# Altium footprint library cool_library.PcbLib: 1182 footprints (part 65 of 75)
Each footprint in its own frame and in the unit in brackets; x right, y up, seen from the top. Pads: shape width x height; smd on the part's side, far side on the other; paste and mask are expansions set on the pad; w line width, h text height; cw(c..) or ccw(c..) is an arc to the next point about the centre after c.
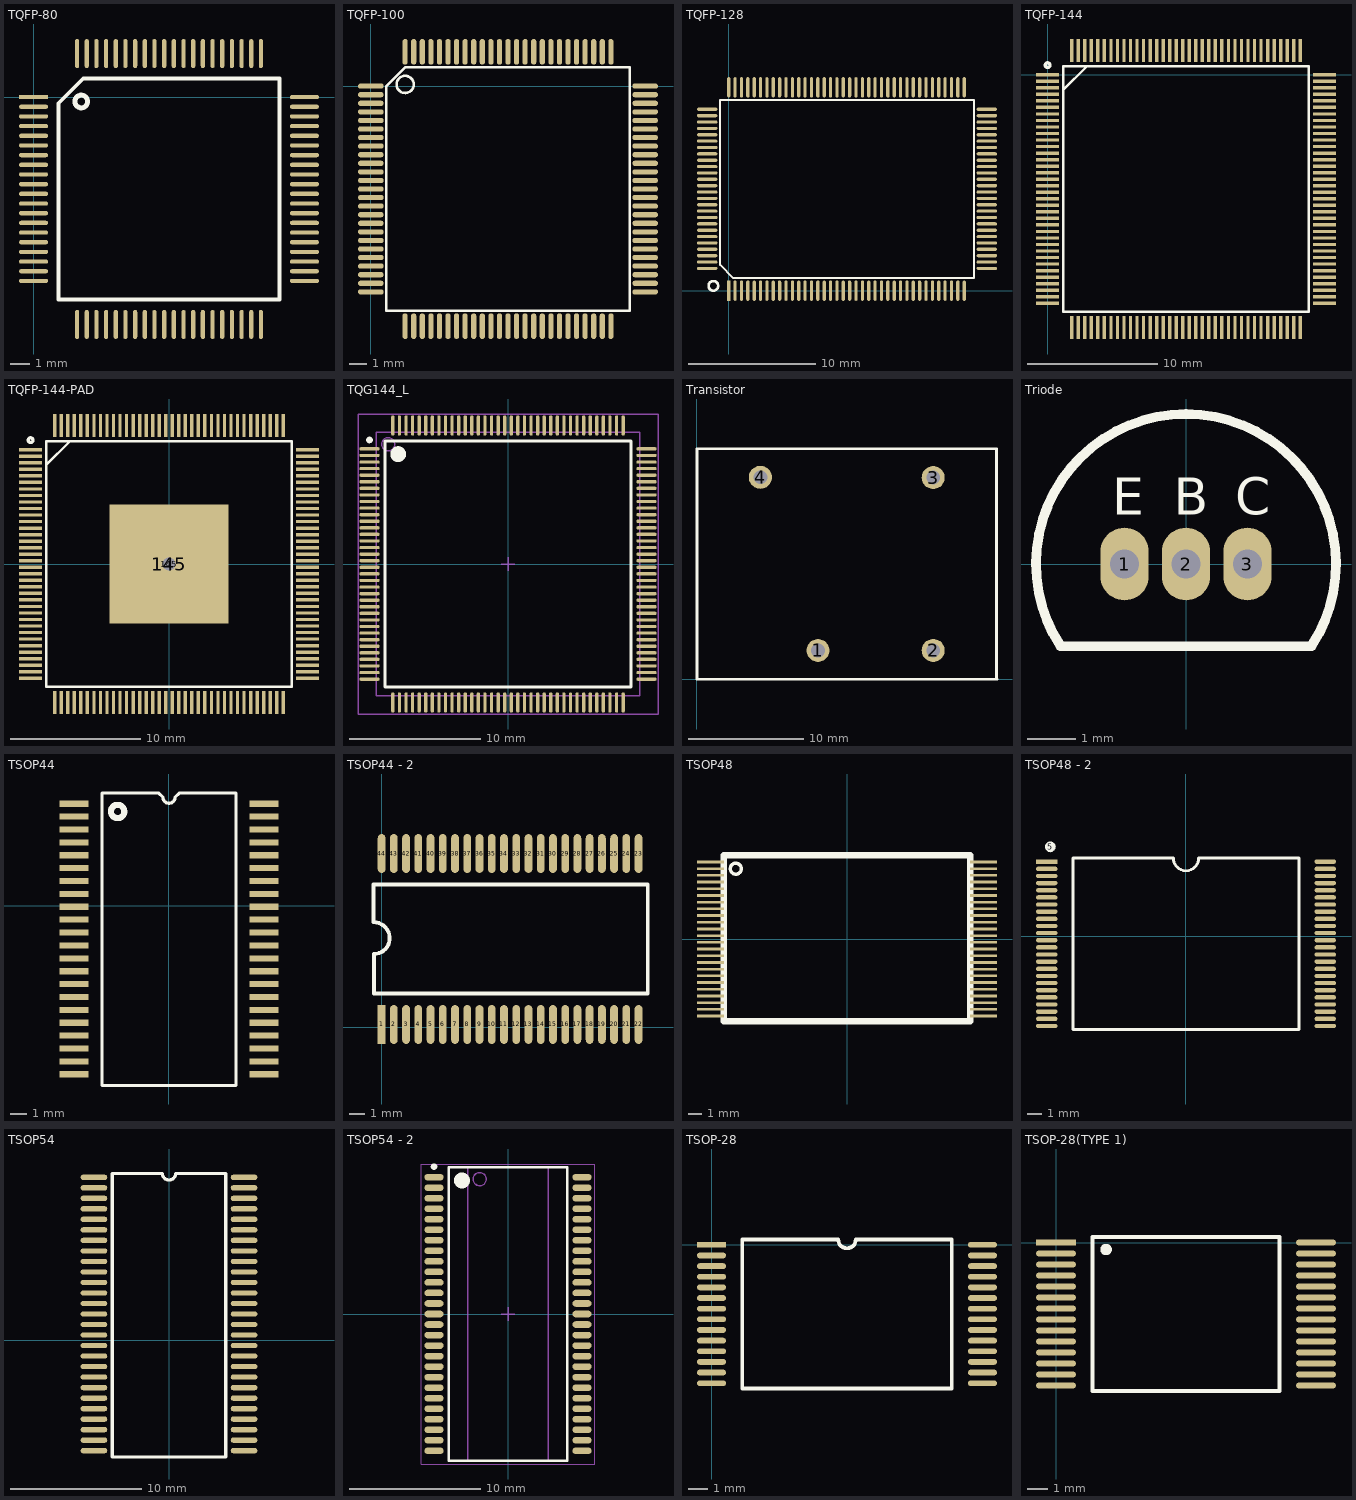
[diagram p64: the footprints below, top view; thin cyan lines are the x and y axes]

## TQFP-80 [mm]
pads (80):
  rect 1.5x0.22 smd: 1(0,0)
  oval 1.5x0.22 smd: 2(0,-0.5) 3(0,-1) 4(0,-1.5) 5(0,-2) 6(0,-2.5) 7(0,-3) 8(0,-3.5) 9(0,-4) 10(0,-4.5) 11(0,-5) 12(0,-5.5) 13(0,-6) 14(0,-6.5) 15(0,-7) 16(0,-7.5) 17(0,-8) 18(0,-8.5) 19(0,-9) 20(0,-9.5) 41(14,-9.5) 42(14,-9) 43(14,-8.5) 44(14,-8) 45(14,-7.5) 46(14,-7) 47(14,-6.5) 48(14,-6) 49(14,-5.5) 50(14,-5) 51(14,-4.5) 52(14,-4) 53(14,-3.5) 54(14,-3) 55(14,-2.5) 56(14,-2) 57(14,-1.5) 58(14,-1) 59(14,-0.5) 60(14,0)
  oval 0.22x1.5 smd: 21(2.25,-11.75) 22(2.75,-11.75) 23(3.25,-11.75) 24(3.75,-11.75) 25(4.25,-11.75) 26(4.75,-11.75) 27(5.25,-11.75) 28(5.75,-11.75) 29(6.25,-11.75) 30(6.75,-11.75) 31(7.25,-11.75) 32(7.75,-11.75) 33(8.25,-11.75) 34(8.75,-11.75) 35(9.25,-11.75) 36(9.75,-11.75) 37(10.25,-11.75) 38(10.75,-11.75) 39(11.25,-11.75) 40(11.75,-11.75) 61(11.75,2.25) 62(11.25,2.25) 63(10.75,2.25) 64(10.25,2.25) 65(9.75,2.25) 66(9.25,2.25) 67(8.75,2.25) 68(8.25,2.25) 69(7.75,2.25) 70(7.25,2.25) 71(6.75,2.25) 72(6.25,2.25) 73(5.75,2.25) 74(5.25,2.25) 75(4.75,2.25) 76(4.25,2.25) 77(3.75,2.25) 78(3.25,2.25) 79(2.75,2.25) 80(2.25,2.25)
Top Overlay:
  circle w0.254: c2.465,-0.229 r0.329
  lines w0.2: 1.285,-10.465 12.715,-10.465 12.715,0.965 2.57,0.965 1.285,-0.32 1.285,-10.465

## TQFP-100 [mm]
pads (100):
  oval 1.5x0.3 smd: 1(0,0) 2(0,-0.5) 3(0,-1) 4(0,-1.5) 5(0,-2) 6(0,-2.5) 7(0,-3) 8(0,-3.5) 9(0,-4) 10(0,-4.5) 11(0,-5) 12(0,-5.5) 13(0,-6) 14(0,-6.5) 15(0,-7) 16(0,-7.5) 17(0,-8) 18(0,-8.5) 19(0,-9) 20(0,-9.5) 21(0,-10) 22(0,-10.5) 23(0,-11) 24(0,-11.5) 25(0,-12) 51(16,-12) 52(16,-11.5) 53(16,-11) 54(16,-10.5) 55(16,-10) 56(16,-9.5) 57(16,-9) 58(16,-8.5) 59(16,-8) 60(16,-7.5) 61(16,-7) 62(16,-6.5) 63(16,-6) 64(16,-5.5) 65(16,-5) 66(16,-4.5) 67(16,-4) 68(16,-3.5) 69(16,-3) 70(16,-2.5) 71(16,-2) 72(16,-1.5) 73(16,-1) 74(16,-0.5) 75(16,0)
  oval 0.3x1.5 smd: 26(2,-14) 27(2.5,-14) 28(3,-14) 29(3.5,-14) 30(4,-14) 31(4.5,-14) 32(5,-14) 33(5.5,-14) 34(6,-14) 35(6.5,-14) 36(7,-14) 37(7.5,-14) 38(8,-14) 39(8.5,-14) 40(9,-14) 41(9.5,-14) 42(10,-14) 43(10.5,-14) 44(11,-14) 45(11.5,-14) 46(12,-14) 47(12.5,-14) 48(13,-14) 49(13.5,-14) 50(14,-14) 76(14,2) 77(13.5,2) 78(13,2) 79(12.5,2) 80(12,2) 81(11.5,2) 82(11,2) 83(10.5,2) 84(10,2) 85(9.5,2) 86(9,2) 87(8.5,2) 88(8,2) 89(7.5,2) 90(7,2) 91(6.5,2) 92(6,2) 93(5.5,2) 94(5,2) 95(4.5,2) 96(4,2) 97(3.5,2) 98(3,2) 99(2.5,2) 100(2,2)
Top Overlay:
  circle w0.152: c2,0.1 r0.5
  lines w0.152: 0.9,-13.1 15.1,-13.1 15.1,1.1 2,1.1 0.9,0 0.9,-13.1

## TQFP-128 [mil]
pads (128):
  rect 10x62.99 smd: 1(0,0)
  oval 10x62.99 smd: 2(19.68,0) 3(39.37,0) 4(59.05,0) 5(78.74,0) 6(98.42,0) 7(118.11,0) 8(137.79,0) 9(157.48,0) 10(177.16,0) 11(196.85,0) 12(216.53,0) 13(236.22,0) 14(255.91,0) 15(275.59,0) 16(295.27,0) 17(314.96,0) 18(334.64,0) 19(354.33,0) 20(374.01,0) 21(393.7,0) 22(413.38,0) 23(433.07,0) 24(452.75,0) 25(472.44,0) 26(492.12,0) 27(511.81,0) 28(531.5,0) 29(551.18,0) 30(570.87,0) 31(590.55,0) 32(610.24,0) 33(629.92,0) 34(649.61,0) 35(669.29,0) 36(688.98,0) 37(708.66,0) 38(728.35,0) 65(728.35,629) 66(708.66,629) 67(688.98,629) 68(669.29,629) 69(649.61,629) 70(629.92,629) 71(610.24,629) 72(590.55,629) 73(570.87,629) 74(551.18,629) 75(531.5,629) 76(511.81,629) 77(492.12,629) 78(472.44,629) 79(452.75,629) 80(433.07,629) 81(413.38,629) 82(393.7,629) 83(374.01,629) 84(354.33,629) 85(334.64,629) 86(314.96,629) 87(295.27,629) 88(275.59,629) 89(255.91,629) 90(236.22,629) 91(216.53,629) 92(196.85,629) 93(177.16,629) 94(157.48,629) 95(137.79,629) 96(118.11,629) 97(98.42,629) 98(78.74,629) 99(59.05,629) 100(39.37,629) 101(19.68,629) 102(0,629)
  oval 62.99x10 smd: 39(798.35,68.88) 40(798.35,88.56) 41(798.35,108.25) 42(798.35,127.93) 43(798.35,147.62) 44(798.35,167.3) 45(798.35,186.99) 46(798.35,206.67) 47(798.35,226.35) 48(798.35,246.04) 49(798.35,265.73) 50(798.35,285.41) 51(798.35,305.1) 52(798.35,324.78) 53(798.35,344.46) 54(798.35,364.15) 55(798.35,383.83) 56(798.35,403.52) 57(798.35,423.2) 58(798.35,442.89) 59(798.35,462.57) 60(798.35,482.26) 61(798.35,501.94) 62(798.35,521.63) 63(798.35,541.32) 64(798.35,561) 103(-66.66,561) 104(-66.66,541.32) 105(-66.66,521.63) 106(-66.66,501.94) 107(-66.66,482.26) 108(-66.66,462.57) 109(-66.66,442.89) 110(-66.66,423.2) 111(-66.66,403.52) 112(-66.66,383.83) 113(-66.66,364.15) 114(-66.66,344.46) 115(-66.66,324.78) 116(-66.66,305.1) 117(-66.66,285.41) 118(-66.66,265.73) 119(-66.66,246.04) 120(-66.66,226.35) 121(-66.66,206.67) 122(-66.66,186.99) 123(-66.66,167.3) 124(-66.66,147.62) 125(-66.66,127.93) 126(-66.66,108.25) 127(-66.66,88.56) 128(-66.66,68.88)
Top Overlay:
  circle w8: c-47.52,14.88 r14.87
  lines w6: -26.66,79.88 14.35,38.88 759.35,38.88 759.35,589.88 -26.66,589.88 -26.66,79.88

## TQFP-144 [mil]
pads (144):
  rect 70x10 smd: 1(0,0) 2(0,-19.68) 3(0,-39.37) 4(0,-59.05) 5(0,-78.74) 6(0,-98.42) 7(0,-118.11) 8(0,-137.79) 9(0,-157.48) 10(0,-177.16) 11(0,-196.85) 12(0,-216.53) 13(0,-236.22) 14(0,-255.91) 15(0,-275.59) 16(0,-295.28) 17(0,-314.96) 18(0,-334.65) 19(0,-354.33) 20(0,-374.02) 21(0,-393.7) 22(0,-413.39) 23(0,-433.07) 24(0,-452.76) 25(0,-472.44) 26(0,-492.13) 27(0,-511.81) 28(0,-531.5) 29(0,-551.18) 30(0,-570.87) 31(0,-590.55) 32(0,-610.24) 33(0,-629.92) 34(0,-649.61) 35(0,-669.29) 36(0,-688.98) 73(834.65,-688.98) 74(834.65,-669.29) 75(834.65,-649.61) 76(834.65,-629.92) 77(834.65,-610.24) 78(834.65,-590.55) 79(834.65,-570.87) 80(834.65,-551.18) 81(834.65,-531.5) 82(834.65,-511.81) 83(834.65,-492.13) 84(834.65,-472.44) 85(834.65,-452.76) 86(834.65,-433.07) 87(834.65,-413.39) 88(834.65,-393.7) 89(834.65,-374.02) 90(834.65,-354.33) 91(834.65,-334.65) 92(834.65,-314.96) 93(834.65,-295.28) 94(834.65,-275.59) 95(834.65,-255.91) 96(834.65,-236.22) 97(834.65,-216.53) 98(834.65,-196.85) 99(834.65,-177.16) 100(834.65,-157.48) 101(834.65,-137.79) 102(834.65,-118.11) 103(834.65,-98.42) 104(834.65,-78.74) 105(834.65,-59.05) 106(834.65,-39.37) 107(834.65,-19.68) 108(834.65,0)
  rect 10x70 smd: 37(72.83,-761.81) 38(92.52,-761.81) 39(112.2,-761.81) 40(131.89,-761.81) 41(151.57,-761.81) 42(171.26,-761.81) 43(190.94,-761.81) 44(210.63,-761.81) 45(230.31,-761.81) 46(250,-761.81) 47(269.69,-761.81) 48(289.37,-761.81) 49(309.06,-761.81) 50(328.74,-761.81) 51(348.43,-761.81) 52(368.11,-761.81) 53(387.8,-761.81) 54(407.48,-761.81) 55(427.17,-761.81) 56(446.85,-761.81) 57(466.54,-761.81) 58(486.22,-761.81) 59(505.91,-761.81) 60(525.59,-761.81) 61(545.28,-761.81) 62(564.96,-761.81) 63(584.65,-761.81) 64(604.33,-761.81) 65(624.02,-761.81) 66(643.7,-761.81) 67(663.39,-761.81) 68(683.07,-761.81) 69(702.76,-761.81) 70(722.44,-761.81) 71(742.13,-761.81) 72(761.81,-761.81) 109(761.81,72.83) 110(742.13,72.83) 111(722.44,72.83) 112(702.76,72.83) 113(683.07,72.83) 114(663.39,72.83) 115(643.7,72.83) 116(624.02,72.83) 117(604.33,72.83) 118(584.65,72.83) 119(564.96,72.83) 120(545.28,72.83) 121(525.59,72.83) 122(505.91,72.83) 123(486.22,72.83) 124(466.54,72.83) 125(446.85,72.83) 126(427.17,72.83) 127(407.48,72.83) 128(387.8,72.83) 129(368.11,72.83) 130(348.43,72.83) 131(328.74,72.83) 132(309.06,72.83) 133(289.37,72.83) 134(269.69,72.83) 135(250,72.83) 136(230.31,72.83) 137(210.63,72.83) 138(190.94,72.83) 139(171.26,72.83) 140(151.57,72.83) 141(131.89,72.83) 142(112.2,72.83) 143(92.52,72.83) 144(72.83,72.83)
Top Overlay:
  circle w9.84: c-0.02,29 r7.02
  lines w7.8: 47.41,-45 118,25.59
  lines w7.87: 47.24,-714.57 47.24,25.59 787.4,25.59 787.4,-714.57 47.24,-714.57

## TQFP-144-PAD [mil]
height 50
pads (146):
  rect 70x10 smd: 1(-417.32,344.49) 2(-417.32,324.8) 3(-417.32,305.12) 4(-417.32,285.43) 5(-417.32,265.75) 6(-417.32,246.06) 7(-417.32,226.38) 8(-417.32,206.69) 9(-417.32,187.01) 10(-417.32,167.32) 11(-417.32,147.64) 12(-417.32,127.95) 13(-417.32,108.27) 14(-417.32,88.58) 15(-417.32,68.9) 16(-417.32,49.21) 17(-417.32,29.53) 18(-417.32,9.84) 19(-417.32,-9.84) 20(-417.32,-29.53) 21(-417.32,-49.21) 22(-417.32,-68.9) 23(-417.32,-88.58) 24(-417.32,-108.27) 25(-417.32,-127.95) 26(-417.32,-147.64) 27(-417.32,-167.32) 28(-417.32,-187.01) 29(-417.32,-206.69) 30(-417.32,-226.38) 31(-417.32,-246.06) 32(-417.32,-265.75) 33(-417.32,-285.43) 34(-417.32,-305.12) 35(-417.32,-324.8) 36(-417.32,-344.49) 73(417.32,-344.49) 74(417.32,-324.8) 75(417.32,-305.12) 76(417.32,-285.43) 77(417.32,-265.75) 78(417.32,-246.06) 79(417.32,-226.38) 80(417.32,-206.69) 81(417.32,-187.01) 82(417.32,-167.32) 83(417.32,-147.64) 84(417.32,-127.95) 85(417.32,-108.27) 86(417.32,-88.58) 87(417.32,-68.9) 88(417.32,-49.21) 89(417.32,-29.53) 90(417.32,-9.84) 91(417.32,9.84) 92(417.32,29.53) 93(417.32,49.21) 94(417.32,68.9) 95(417.32,88.58) 96(417.32,108.27) 97(417.32,127.95) 98(417.32,147.64) 99(417.32,167.32) 100(417.32,187.01) 101(417.32,206.69) 102(417.32,226.38) 103(417.32,246.06) 104(417.32,265.75) 105(417.32,285.43) 106(417.32,305.12) 107(417.32,324.8) 108(417.32,344.49)
  rect 10x70 smd: 37(-344.49,-417.32) 38(-324.8,-417.32) 39(-305.12,-417.32) 40(-285.43,-417.32) 41(-265.75,-417.32) 42(-246.06,-417.32) 43(-226.38,-417.32) 44(-206.69,-417.32) 45(-187.01,-417.32) 46(-167.32,-417.32) 47(-147.64,-417.32) 48(-127.95,-417.32) 49(-108.27,-417.32) 50(-88.58,-417.32) 51(-68.9,-417.32) 52(-49.21,-417.32) 53(-29.53,-417.32) 54(-9.84,-417.32) 55(9.84,-417.32) 56(29.53,-417.32) 57(49.21,-417.32) 58(68.9,-417.32) 59(88.58,-417.32) 60(108.27,-417.32) 61(127.95,-417.32) 62(147.64,-417.32) 63(167.32,-417.32) 64(187.01,-417.32) 65(206.69,-417.32) 66(226.38,-417.32) 67(246.06,-417.32) 68(265.75,-417.32) 69(285.43,-417.32) 70(305.12,-417.32) 71(324.8,-417.32) 72(344.49,-417.32) 109(344.49,417.32) 110(324.8,417.32) 111(305.12,417.32) 112(285.43,417.32) 113(265.75,417.32) 114(246.06,417.32) 115(226.38,417.32) 116(206.69,417.32) 117(187.01,417.32) 118(167.32,417.32) 119(147.64,417.32) 120(127.95,417.32) 121(108.27,417.32) 122(88.58,417.32) 123(68.9,417.32) 124(49.21,417.32) 125(29.53,417.32) 126(9.84,417.32) 127(-9.84,417.32) 128(-29.53,417.32) 129(-49.21,417.32) 130(-68.9,417.32) 131(-88.58,417.32) 132(-108.27,417.32) 133(-127.95,417.32) 134(-147.64,417.32) 135(-167.32,417.32) 136(-187.01,417.32) 137(-206.69,417.32) 138(-226.38,417.32) 139(-246.06,417.32) 140(-265.75,417.32) 141(-285.43,417.32) 142(-305.12,417.32) 143(-324.8,417.32) 144(-344.49,417.32)
  rect 360x360 smd: 145(0,0)
  oct 62x62 hole 40: 145(0,0)
Top Overlay:
  circle w9.84: c-417.35,373.49 r7.02
  lines w7.8: -369.91,299.49 -299.32,370.08
  lines w7.87: -370.08,-370.08 370.08,-370.08 370.08,370.08 -370.08,370.08 -370.08,-370.08
Top Solder:
  region: 30,180 30,30 180,30 180,180
  region: 180,-30 30,-30 30,-180 180,-180
  region: -30,-180 -30,-30 -180,-30 -180,-180
  rectangle: -180,30 -30,180

## TQG144_L [mm] "Thin QFP, 144-Leads, Body 20x20mm, Pitch 0.5mm, IPC High Density"
height 1.6
pads (144):
  oval 1.55x0.25 smd: 1(-10.525,8.75) 2(-10.525,8.25) 3(-10.525,7.75) 4(-10.525,7.25) 5(-10.525,6.75) 6(-10.525,6.25) 7(-10.525,5.75) 8(-10.525,5.25) 9(-10.525,4.75) 10(-10.525,4.25) 11(-10.525,3.75) 12(-10.525,3.25) 13(-10.525,2.75) 14(-10.525,2.25) 15(-10.525,1.75) 16(-10.525,1.25) 17(-10.525,0.75) 18(-10.525,0.25) 19(-10.525,-0.25) 20(-10.525,-0.75) 21(-10.525,-1.25) 22(-10.525,-1.75) 23(-10.525,-2.25) 24(-10.525,-2.75) 25(-10.525,-3.25) 26(-10.525,-3.75) 27(-10.525,-4.25) 28(-10.525,-4.75) 29(-10.525,-5.25) 30(-10.525,-5.75) 31(-10.525,-6.25) 32(-10.525,-6.75) 33(-10.525,-7.25) 34(-10.525,-7.75) 35(-10.525,-8.25) 36(-10.525,-8.75) 73(10.525,-8.75) 74(10.525,-8.25) 75(10.525,-7.75) 76(10.525,-7.25) 77(10.525,-6.75) 78(10.525,-6.25) 79(10.525,-5.75) 80(10.525,-5.25) 81(10.525,-4.75) 82(10.525,-4.25) 83(10.525,-3.75) 84(10.525,-3.25) 85(10.525,-2.75) 86(10.525,-2.25) 87(10.525,-1.75) 88(10.525,-1.25) 89(10.525,-0.75) 90(10.525,-0.25) 91(10.525,0.25) 92(10.525,0.75) 93(10.525,1.25) 94(10.525,1.75) 95(10.525,2.25) 96(10.525,2.75) 97(10.525,3.25) 98(10.525,3.75) 99(10.525,4.25) 100(10.525,4.75) 101(10.525,5.25) 102(10.525,5.75) 103(10.525,6.25) 104(10.525,6.75) 105(10.525,7.25) 106(10.525,7.75) 107(10.525,8.25) 108(10.525,8.75)
  oval 0.25x1.55 smd: 37(-8.75,-10.525) 38(-8.25,-10.525) 39(-7.75,-10.525) 40(-7.25,-10.525) 41(-6.75,-10.525) 42(-6.25,-10.525) 43(-5.75,-10.525) 44(-5.25,-10.525) 45(-4.75,-10.525) 46(-4.25,-10.525) 47(-3.75,-10.525) 48(-3.25,-10.525) 49(-2.75,-10.525) 50(-2.25,-10.525) 51(-1.75,-10.525) 52(-1.25,-10.525) 53(-0.75,-10.525) 54(-0.25,-10.525) 55(0.25,-10.525) 56(0.75,-10.525) 57(1.25,-10.525) 58(1.75,-10.525) 59(2.25,-10.525) 60(2.75,-10.525) 61(3.25,-10.525) 62(3.75,-10.525) 63(4.25,-10.525) 64(4.75,-10.525) 65(5.25,-10.525) 66(5.75,-10.525) 67(6.25,-10.525) 68(6.75,-10.525) 69(7.25,-10.525) 70(7.75,-10.525) 71(8.25,-10.525) 72(8.75,-10.525) 109(8.75,10.525) 110(8.25,10.525) 111(7.75,10.525) 112(7.25,10.525) 113(6.75,10.525) 114(6.25,10.525) 115(5.75,10.525) 116(5.25,10.525) 117(4.75,10.525) 118(4.25,10.525) 119(3.75,10.525) 120(3.25,10.525) 121(2.75,10.525) 122(2.25,10.525) 123(1.75,10.525) 124(1.25,10.525) 125(0.75,10.525) 126(0.25,10.525) 127(-0.25,10.525) 128(-0.75,10.525) 129(-1.25,10.525) 130(-1.75,10.525) 131(-2.25,10.525) 132(-2.75,10.525) 133(-3.25,10.525) 134(-3.75,10.525) 135(-4.25,10.525) 136(-4.75,10.525) 137(-5.25,10.525) 138(-5.75,10.525) 139(-6.25,10.525) 140(-6.75,10.525) 141(-7.25,10.525) 142(-7.75,10.525) 143(-8.25,10.525) 144(-8.75,10.525)
Top Overlay:
  circle w0.6: c-8.35,8.35 r0.3
  circle w0.25: c-10.525,9.425 r0.125
  lines w0.2: -9.35,-9.35 9.35,-9.35 9.35,9.35 -9.35,9.35 -9.35,-9.35
Mechanical 13:
  circle w0.1: c-9.1,9.1 r0.5
  lines w0.1: -10,-10 10,-10 10,10 -10,10 -10,-10
Mechanical 15:
  lines w0.1: -0.5,0 0.5,0 ; 0,-0.5 0,0.5 ; -11.4,-11.4 11.4,-11.4 11.4,11.4 -11.4,11.4 -11.4,-11.4
3D body: height 1.6, standoff 0, extent -10,-10 10,10

## Transistor [mm]
pads (4):
  round 2 hole 1.2: 1(10.5,2.5) 2(20.5,2.5) 3(20.5,17.5) 4(5.5,17.526)
Top Overlay:
  lines w0.254: 26,0 26,20 0,20 0,0 26.035,0

## Triode [mm]
pads (3):
  oval 1x1.5 hole 0.6: 1(-1.27,0) 2(0,0) 3(1.27,0)
Top Overlay:
  circle w0.2: c0,0 r0.129
  lines w0.2: -2.592,-1.7 cw(c0,0) 2.592,-1.7 -2.592,-1.7
  text "E" at -1.524,1.016 h0.76
  text "B" at -0.254,1.016 h0.76
  text "C" at 1.016,1.016 h0.76
3D body: height 10.31, standoff -5.8, extent -3.12,-1.68 3.08,3.13

## TSOP44 [mil] "贴片"
pads (44):
  rect 72x15 smd: 1(-231.5,249.21) 2(-231.5,217.72) 3(-231.5,186.22) 4(-231.5,154.72) 5(-231.5,123.23) 6(-231.5,91.73) 7(-231.5,60.24) 8(-231.5,28.74) 9(-231.5,-2.76) 10(-231.5,-34.25) 11(-231.5,-65.75) 12(-231.5,-97.24) 13(-231.5,-128.74) 14(-231.5,-160.24) 15(-231.5,-191.73) 16(-231.5,-223.23) 17(-231.5,-254.73) 18(-231.5,-286.22) 19(-231.5,-317.72) 20(-231.5,-349.21) 21(-231.5,-380.71) 22(-231.5,-412.21) 23(233.07,-412.21) 24(233.07,-380.71) 25(233.07,-349.21) 26(233.07,-317.72) 27(233.07,-286.22) 28(233.07,-254.73) 29(233.07,-223.23) 30(233.07,-191.73) 31(233.07,-160.24) 32(233.07,-128.74) 33(233.07,-97.24) 34(233.07,-65.75) 35(233.07,-34.25) 36(233.07,-2.76) 37(233.07,28.74) 38(233.07,60.24) 39(233.07,91.73) 40(233.07,123.23) 41(233.07,154.72) 42(233.07,186.22) 43(233.07,217.72) 44(233.07,249.21)
Top Overlay:
  lines w7.87: -163.19,-439.37 164.76,-439.37 164.76,275.2 25.77,275.2 15.54,264.96 cw(c0.79,264.96) -13.96,264.96 -24.2,275.2 -163.19,275.2 -163.19,-439.37
  lines w15: -108.5,230.21 cw(c-124.8,230.21) -108.51,230.89

## TSOP44 - 2 [mil]
pads (44):
  rect 20x100 smd: 1(0,7)
  oval 20x100 smd: 2(31.5,7) 3(63,7) 4(94.5,7) 5(126,7) 6(157.5,7) 7(189,7) 8(220.5,7) 9(252,7) 10(283.5,7) 11(315,7) 12(346.5,7) 13(378,7) 14(409.5,7) 15(441,7) 16(472.5,7) 17(504,7) 18(535.5,7) 19(567,7) 20(598.5,7) 21(630,7) 22(661.5,7) 23(661.5,447) 24(630,447) 25(598.5,447) 26(567,447) 27(535.5,447) 28(504,447) 29(472.5,447) 30(441,447) 31(409.5,447) 32(378,447) 33(346.5,447) 34(315,447) 35(283.5,447) 36(252,447) 37(220.5,447) 38(189,447) 39(157.5,447) 40(126,447) 41(94.5,447) 42(63,447) 43(31.5,447) 44(0,447)
Top Overlay:
  lines w10: -20.59,270 -20.59,367 685,367 685,87 -20,87 -20,183.41 ; -20,188.4 ccw(c-20,229.2) -20,270
3D body: height 48.24, standoff -3.69, extent -27.46,-5 689.47,457.99

## TSOP48 [mm]
pads (48):
  rect 2x0.2 smd: 1(-10.2,5.75) 2(-10.2,5.25) 3(-10.2,4.75) 4(-10.2,4.25) 5(-10.2,3.75) 6(-10.2,3.25) 7(-10.2,2.75) 8(-10.2,2.25) 9(-10.2,1.75) 10(-10.2,1.25) 11(-10.2,0.75) 12(-10.2,0.25) 13(-10.2,-0.25) 14(-10.2,-0.75) 15(-10.2,-1.25) 16(-10.2,-1.75) 17(-10.2,-2.25) 18(-10.2,-2.75) 19(-10.2,-3.25) 20(-10.2,-3.75) 21(-10.2,-4.25) 22(-10.2,-4.75) 23(-10.2,-5.25) 24(-10.2,-5.75) 25(10.2,-5.75) 26(10.2,-5.25) 27(10.2,-4.75) 28(10.2,-4.25) 29(10.2,-3.75) 30(10.2,-3.25) 31(10.2,-2.75) 32(10.2,-2.25) 33(10.2,-1.75) 34(10.2,-1.25) 35(10.2,-0.75) 36(10.2,-0.25) 37(10.2,0.25) 38(10.2,0.75) 39(10.2,1.25) 40(10.2,1.75) 41(10.2,2.25) 42(10.2,2.75) 43(10.2,3.25) 44(10.2,3.75) 45(10.2,4.25) 46(10.2,4.75) 47(10.2,5.25) 48(10.2,5.75)
Top Overlay:
  circle w0.254: c-8.3,5.25 r0.412
  lines w0.5: -9.2,-6.15 -9.2,6.25 9.2,6.25 9.2,-6.15 -9.2,-6.15

## TSOP48 - 2 [mm]
pads (49):
  rect 1.5x0.3 smd: 1(-9.754,5.229)
  oval 1.5x0.3 smd: 2(-9.754,4.729) 3(-9.754,4.229) 4(-9.754,3.729) 5(-9.754,3.229) 6(-9.754,2.729) 7(-9.754,2.229) 8(-9.754,1.729) 9(-9.754,1.229) 10(-9.754,0.729) 11(-9.754,0.229) 12(-9.754,-0.271) 13(-9.754,-0.771) 14(-9.754,-1.271) 15(-9.754,-1.771) 16(-9.754,-2.271) 17(-9.754,-2.771) 18(-9.754,-3.271) 19(-9.754,-3.771) 20(-9.754,-4.271) 21(-9.754,-4.771) 22(-9.754,-5.271) 23(-9.754,-5.771) 24(-9.754,-6.271) 25(9.754,-6.271) 26(9.754,-5.771) 27(9.754,-5.271) 28(9.754,-4.771) 29(9.754,-4.271) 30(9.754,-3.771) 31(9.754,-3.271) 32(9.754,-2.771) 33(9.754,-2.271) 34(9.754,-1.771) 35(9.754,-1.271) 36(9.754,-0.771) 37(9.754,-0.271) 38(9.754,0.229) 39(9.754,0.729) 40(9.754,1.229) 41(9.754,1.729) 42(9.754,2.229) 43(9.754,2.729) 44(9.754,3.229) 45(9.754,3.729) 46(9.754,4.229) 47(9.754,4.729) 48(9.754,5.229)
  round 0.762 on Top Overlay: 5(-9.5,6.271)
Top Overlay:
  lines w0.2: -7.915,-6.521 -7.915,5.479 -0.883,5.479 ccw(c0,5.479) 0.883,5.479 7.915,5.479 7.915,-6.521 -7.915,-6.521
3D body: height 1.2, standoff -0.06, extent -10.05,-6.591 10.05,5.509

## TSOP54 [mil]
height 200
pads (54):
  oval 80x16 smd: 1(-225,488.25) 2(-225,456.75) 3(-225,425.25) 4(-225,393.75) 5(-225,362.25) 6(-225,330.75) 7(-225,299.25) 8(-225,267.75) 9(-225,236.25) 10(-225,204.75) 11(-225,173.25) 12(-225,141.75) 13(-225,110.25) 14(-225,78.75) 15(-225,47.25) 16(-225,15.75) 17(-225,-15.75) 18(-225,-47.25) 19(-225,-78.75) 20(-225,-110.25) 21(-225,-141.75) 22(-225,-173.25) 23(-225,-204.75) 24(-225,-236.25) 25(-225,-267.75) 26(-225,-299.25) 27(-225,-330.75) 28(225,-330.75) 29(225,-299.25) 30(225,-267.75) 31(225,-236.25) 32(225,-204.75) 33(225,-173.25) 34(225,-141.75) 35(225,-110.25) 36(225,-78.75) 37(225,-47.25) 38(225,-15.75) 39(225,15.75) 40(225,47.25) 41(225,78.75) 42(225,110.25) 43(225,141.75) 44(225,173.25) 45(225,204.75) 46(225,236.25) 47(225,267.75) 48(225,299.25) 49(225,330.75) 50(225,362.25) 51(225,393.75) 52(225,425.25) 53(225,456.75) 54(225,488.25)
Top Overlay:
  lines w10: -170,-350 -170,500 -20,500 ccw(c0,500) 20,500 170,500 170,-350 -170,-350

## TSOP54 - 2 [mm] "TSOP, 54-Leads, Body 22.20x6.00mm, Pitch 0.80mm, IPC Medium Density"
height 1.1
pads (54):
  oval 1.45x0.5 smd: 1(-5.625,10.4) 2(-5.625,9.6) 3(-5.625,8.8) 4(-5.625,8) 5(-5.625,7.2) 6(-5.625,6.4) 7(-5.625,5.6) 8(-5.625,4.8) 9(-5.625,4) 10(-5.625,3.2) 11(-5.625,2.4) 12(-5.625,1.6) 13(-5.625,0.8) 14(-5.625,0) 15(-5.625,-0.8) 16(-5.625,-1.6) 17(-5.625,-2.4) 18(-5.625,-3.2) 19(-5.625,-4) 20(-5.625,-4.8) 21(-5.625,-5.6) 22(-5.625,-6.4) 23(-5.625,-7.2) 24(-5.625,-8) 25(-5.625,-8.8) 26(-5.625,-9.6) 27(-5.625,-10.4) 28(5.625,-10.4) 29(5.625,-9.6) 30(5.625,-8.8) 31(5.625,-8) 32(5.625,-7.2) 33(5.625,-6.4) 34(5.625,-5.6) 35(5.625,-4.8) 36(5.625,-4) 37(5.625,-3.2) 38(5.625,-2.4) 39(5.625,-1.6) 40(5.625,-0.8) 41(5.625,0) 42(5.625,0.8) 43(5.625,1.6) 44(5.625,2.4) 45(5.625,3.2) 46(5.625,4) 47(5.625,4.8) 48(5.625,5.6) 49(5.625,6.4) 50(5.625,7.2) 51(5.625,8) 52(5.625,8.8) 53(5.625,9.6) 54(5.625,10.4)
Top Overlay:
  circle w0.6: c-3.5,10.15 r0.3
  circle w0.25: c-5.625,11.2 r0.125
  lines w0.2: -4.5,-11.15 4.5,-11.15 4.5,11.15 -4.5,11.15 -4.5,-11.15
Mechanical 13:
  circle w0.1: c-2.15,10.25 r0.5
  lines w0.1: -3.05,-11.15 3.05,-11.15 3.05,11.15 -3.05,11.15 -3.05,-11.15
Mechanical 15:
  lines w0.05: -6.6,-11.4 6.6,-11.4 6.6,11.4 -6.6,11.4 -6.6,-11.4
  lines w0.1: -0.5,0 0.5,0 ; 0,-0.5 0,0.5
3D body: height 1.25, standoff 0, extent -5.855,-11.095 5.906,11.125

## TSOP-28 [mm]
pads (28):
  rect 1.5x0.3 smd: 1(0,0)
  oval 1.5x0.3 smd: 2(0,-0.55) 3(0,-1.1) 4(0,-1.65) 5(0,-2.2) 6(0,-2.75) 7(0,-3.3) 8(0,-3.85) 9(0,-4.4) 10(0,-4.95) 11(0,-5.5) 12(0,-6.05) 13(0,-6.6) 14(0,-7.15) 15(14,-7.15) 16(14,-6.6) 17(14,-6.05) 18(14,-5.5) 19(14,-4.95) 20(14,-4.4) 21(14,-3.85) 22(14,-3.3) 23(14,-2.75) 24(14,-2.2) 25(14,-1.65) 26(14,-1.1) 27(14,-0.55) 28(14,0)
Top Overlay:
  lines w0.2: 1.585,-7.425 1.585,0.275 6.547,0.275 ccw(c7,0.275) 7.453,0.275 12.415,0.275 12.415,-7.425 1.585,-7.425

## TSOP-28(TYPE 1) [mm]
pads (28):
  rect 2x0.28 smd: 1(0,0)
  oval 2x0.28 smd: 2(0,-0.55) 3(0,-1.1) 4(0,-1.65) 5(0,-2.2) 6(0,-2.75) 7(0,-3.3) 8(0,-3.85) 9(0,-4.4) 10(0,-4.95) 11(0,-5.5) 12(0,-6.05) 13(0,-6.6) 14(0,-7.15) 15(13,-7.15) 16(13,-6.6) 17(13,-6.05) 18(13,-5.5) 19(13,-4.95) 20(13,-4.4) 21(13,-3.85) 22(13,-3.3) 23(13,-2.75) 24(13,-2.2) 25(13,-1.65) 26(13,-1.1) 27(13,-0.55) 28(13,0)
Top Overlay:
  circle w0.3: c2.503,-0.35 r0.137
  lines w0.2: 1.835,-7.425 11.165,-7.425 11.165,0.275 1.835,0.275 1.835,-7.425